# Altium footprint library DrPCB.PcbLib: 910 footprints (part 36 of 57)
Each footprint in its own frame and in the unit in brackets; x right, y up, seen from the top. Pads: shape width x height; smd on the part's side, far side on the other; paste and mask are expansions set on the pad; w line width, h text height; cw(c..) or ccw(c..) is an arc to the next point about the centre after c.
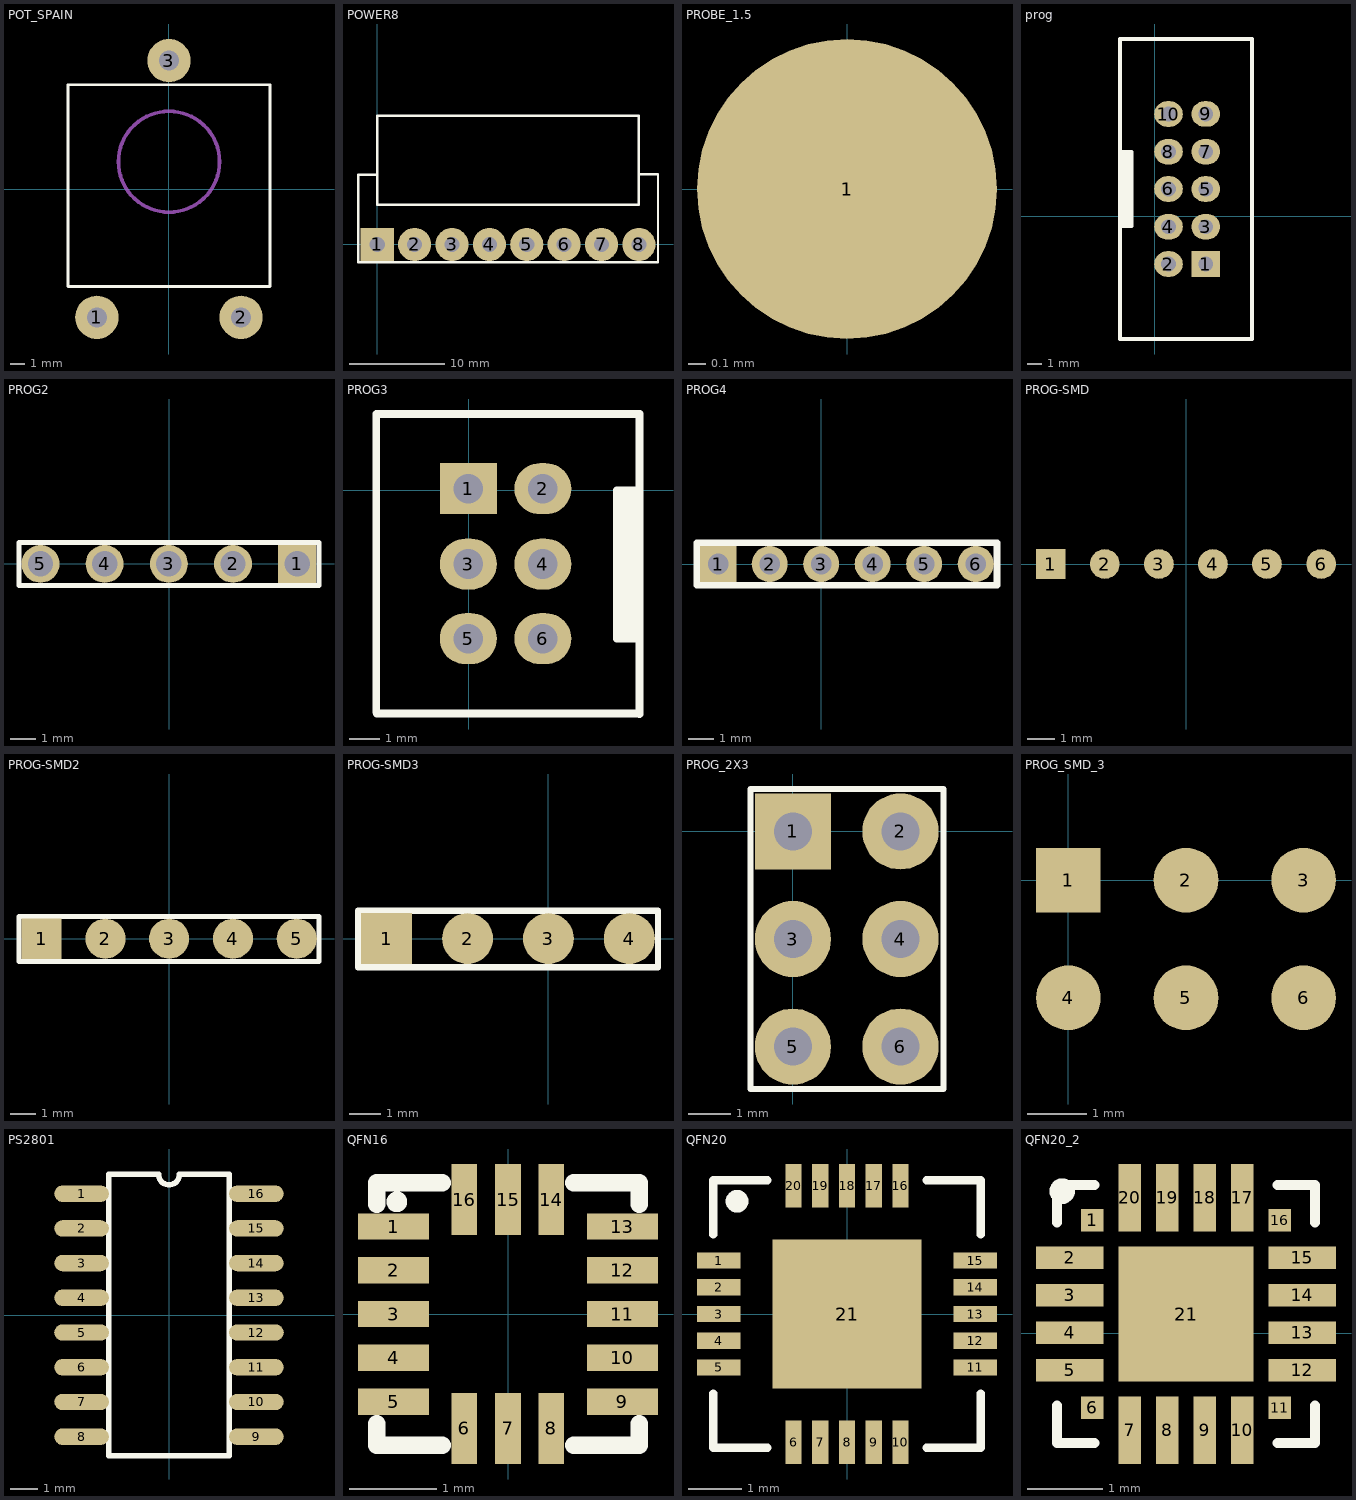
[diagram p35: the footprints below, top view; thin cyan lines are the x and y axes]

## POT_SPAIN [mm]
pads (3):
  round 3 hole 1.4: 1(-5,-8.9) 2(5,-8.9) 3(0,8.9)
Top Overlay:
  lines w0.2: -7,-6.771 7,-6.771 7,7.229 -7,7.229 -7,-6.771
Mechanical 13:
  circle w0.254: c0,1.892 r3.5

## POWER8 [mm]
pads (8):
  rect 3.5x3.5 hole 1.6: 1(0,0)
  round 3.5 hole 1.6: 2(3.943,0) 3(7.886,0) 4(11.829,0) 5(15.771,0) 6(19.714,0) 7(23.657,0) 8(27.6,0)
Top Overlay:
  lines w0.254: -2.032,7.366 -0.025,7.366 0,7.391 ; -2.019,-1.892 -2.019,7.379 ; -2,-1.892 29.6,-1.892 ; -0.013,4.204 -0.013,13.589 0,13.602 ; 0,4.2 27.6,4.2 ; 0,13.6 27.6,13.6 ; 27.597,4.216 27.597,13.589 ; 27.61,7.404 29.604,7.404 ; 29.616,-1.88 29.616,7.391

## PROBE_1.5 [mm]
pads (1):
  round 1.7 smd mask+0: 1(0,0)

## prog [mil]
pads (10):
  rect 75x67 hole 39: 1(134.29,-125.8)
  oval 75x67.01 hole 39.02: 2(36.3,-125.8) 3(134.29,-27.81) 6(36.3,71.21) 7(134.29,169.2) 9(134.29,268.22)
  oval 75x67 hole 39: 4(36.29,-27.8) 5(134.29,71.2) 8(36.29,169.2) 10(36.29,268.2)
Top Overlay:
  lines w10: -90.71,169.2 -60.71,169.2 -60.71,-25.8 -85.71,-25.8 ; -80.71,-20.8 -80.71,169.2 ; -75.71,-25.8 -75.71,169.2 ; -70.71,-25.8 -70.71,169.2 ; -90.71,-322.8 -90.71,-125.8 -90.71,268.2 -90.71,465.2 255.29,465.2 255.29,-322.8 -90.71,-322.8

## PROG2 [mm]
pads (5):
  rect 1.5x1.5 hole 1: 1(5.067,0)
  round 1.5 hole 1: 2(2.527,0) 3(-0.013,0) 4(-2.553,0) 5(-5.093,0)
Top Overlay:
  lines w0.2: -5.944,-0.851 -5.944,0.838 5.931,0.838 5.931,-0.851 -5.944,-0.851

## PROG3 [mil]
pads (6):
  rect 75x67.01 hole 39.02: 1(-0.29,1.81)
  oval 75x67 hole 39: 2(97.71,1.8) 3(-0.29,-97.2) 6(97.71,-195.2)
  oval 75x67.01 hole 39.02: 4(97.7,-97.21) 5(-0.29,-195.2)
Top Overlay:
  lines w10: -121.29,-292 -121.29,99.5 ; -121,100 225,100 ; -120.5,-293.5 225,-293.5 ; 204.71,-195.2 204.71,-0.2 ; 209.71,-195.2 209.71,-0.2 ; 214.71,-195.2 214.71,-5.2 ; 219.71,-0.2 194.71,-0.2 194.71,-195.2 224.71,-195.2 ; 224.71,-294.2 224.71,99.8

## PROG4 [mm]
pads (6):
  rect 1.4x1.4 hole 0.8: 1(-4,0)
  round 1.4 hole 0.8: 2(-2,0) 3(0,0) 4(2,0) 5(4,0) 6(6.007,0)
Top Overlay:
  lines w0.254: 6.794,-0.826 -4.826,-0.826 -4.826,0.826 6.807,0.826 ; 6.833,-0.826 6.833,0.826

## PROG-SMD [mm]
pads (6):
  rect 1.1x1.1 smd: 1(-5.003,0)
  round 1.1 smd: 2(-3.003,0) 3(-1.003,0) 4(0.997,0) 5(2.997,0) 6(5.003,0)

## PROG-SMD2 [mm]
pads (5):
  rect 1.6x1.6 smd: 1(-5.08,0)
  round 1.6 smd: 2(-2.54,0) 3(0,0) 4(2.54,0) 5(5.08,0)
Top Overlay:
  lines w0.2: -5.982,-0.902 5.969,-0.902 5.969,0.876 -5.982,0.876 -5.982,-0.902

## PROG-SMD3 [mm]
pads (4):
  rect 1.6x1.6 smd: 1(-5.08,0)
  round 1.6 smd: 2(-2.54,0) 3(0,0) 4(2.54,0)
Top Overlay:
  lines w0.2: -5.982,-0.902 -5.982,0.876 3.442,0.876 3.442,-0.902 -5.982,-0.902

## PROG_2X3 [mm]
pads (6):
  rect 1.8x1.8 hole 0.9: 1(0,0)
  round 1.8 hole 0.9: 2(2.54,0) 3(0,-2.54) 4(2.54,-2.54) 5(0,-5.08) 6(2.54,-5.08)
Top Overlay:
  lines w0.15: -1.003,-6.083 -1.003,1.003 3.556,1.003 3.556,-6.083 -1.003,-6.083

## PROG_SMD_3 [mm]
pads (6):
  rect 1.1x1.1 smd: 1(0,0)
  round 1.1 smd: 2(2,0) 3(4,0) 4(0,-2) 5(2,-2) 6(4,-2)

## PS2801 [mm]
pads (16):
  oval 2x0.6 smd: 1(-3.2,4.445) 2(-3.2,3.175) 3(-3.2,1.905) 4(-3.2,0.635) 5(-3.2,-0.635) 6(-3.2,-1.905) 7(-3.2,-3.175) 8(-3.2,-4.445) 9(3.2,-4.445) 10(3.2,-3.175) 11(3.2,-1.905) 12(3.2,-0.635) 13(3.2,0.635) 14(3.2,1.905) 15(3.2,3.175) 16(3.2,4.445)
Top Overlay:
  lines w0.2: -2.2,-5.15 2.2,-5.15 ; -2.2,-5.131 -2.2,5.15 -0.381,5.15 ccw(c0,5.15) 0.381,5.15 2.2,5.15 2.2,-5.143

## QFN16 [mm]
pads (16):
  rect 0.813x0.3 smd mask+0.05: 1(-1.308,1) 2(-1.308,0.5) 3(-1.308,0) 4(-1.308,-0.5) 5(-1.308,-1.003) 9(1.308,-1.003) 10(1.308,-0.5) 11(1.308,0) 12(1.308,0.5) 13(1.308,1)
  rect 0.295x0.813 smd mask+0.05: 6(-0.5,-1.308) 7(0,-1.308) 8(0.495,-1.308) 14(0.495,1.308) 15(0,1.308) 16(-0.5,1.308)
Top Overlay:
  circle w0.2: c-1.27,1.283 r0.018
  lines w0.2: -1.5,-1.257 -1.5,-1.5 -0.749,-1.5 ; -1.5,1.257 -1.5,1.5 -0.749,1.5 ; 0.749,-1.5 1.5,-1.5 1.5,-1.257 ; 0.749,1.5 1.5,1.5 1.5,1.257
3D body "User Library-MMA8451Q.step": height 1.01, standoff 0.01, extent -1.501,-1.501 1.501,1.501

## QFN20 [mil]
pads (21):
  rect 32x12 smd: 1(-94.43,39.37) 2(-94.43,19.68) 3(-94.43,0) 4(-94.43,-19.68) 5(-94.43,-39.37) 11(94.43,-39.37) 12(94.43,-19.68) 13(94.43,0) 14(94.43,19.68) 15(94.43,39.37)
  rect 12x32 smd: 6(-39.37,-94.43) 7(-19.68,-94.43) 8(0,-94.43) 9(19.68,-94.43) 10(39.37,-94.43) 16(39.37,94.43) 17(19.68,94.43) 18(0,94.43) 19(-19.68,94.43) 20(-39.37,94.43)
  rect 110x110 smd: 21(0,0)
Top Overlay:
  circle w10: c-81,83 r3.35
  lines w6: -98.43,-58.47 -98.43,-98.43 -58.47,-98.43 ; -98.43,58.47 -98.43,98.43 -58.47,98.43 ; 58.47,-98.43 98.43,-98.43 98.43,-58.47 ; 58.47,98.43 98.43,98.43 98.43,58.47
3D body "QFN20_5x5MC.step": height 37.98, standoff 0.5, extent -98.42,-98.42 98.43,98.43

## QFN20_2 [mm]
pads (21):
  rect 0.3x0.3 smd: 1(-3.536,1.504) 6(-3.536,-0.996) 11(-1.036,-0.996) 16(-1.036,1.504)
  rect 0.9x0.3 smd: 2(-3.836,1.004) 3(-3.836,0.504) 4(-3.836,0.004) 5(-3.836,-0.496) 12(-0.736,-0.496) 13(-0.736,0.004) 14(-0.736,0.504) 15(-0.736,1.004)
  rect 0.3x0.9 smd: 7(-3.036,-1.296) 8(-2.536,-1.296) 9(-2.036,-1.296) 10(-1.536,-1.296) 17(-1.536,1.804) 18(-2.036,1.804) 19(-2.536,1.804) 20(-3.036,1.804)
  rect 1.8x1.8 smd paste-2: 21(-2.286,0.254)
Top Overlay:
  circle w0.2: c-3.937,1.892 r0.07
  lines w0.127: -4.006,-0.966 -4.006,-1.466 -3.506,-1.466 ; -4.006,1.474 -4.006,1.974 -3.506,1.974 ; -1.066,-1.466 -0.566,-1.466 -0.566,-0.966 ; -1.066,1.974 -0.566,1.974 -0.566,1.474
Top Paste:
  region: -1.717,-0.315 -2.855,-0.315 -2.855,0.823 -1.717,0.823
3D body "CP2102N-A01-GQFN20.STEP": height 0.8, standoff 0, extent -3.786,-1.246 -0.786,1.754